# Altium footprint library ALL.PcbLib: 385 footprints (part 8 of 25)
Each footprint in its own frame and in the unit in brackets; x right, y up, seen from the top. Pads: shape width x height; smd on the part's side, far side on the other; paste and mask are expansions set on the pad; w line width, h text height; cw(c..) or ccw(c..) is an arc to the next point about the centre after c.
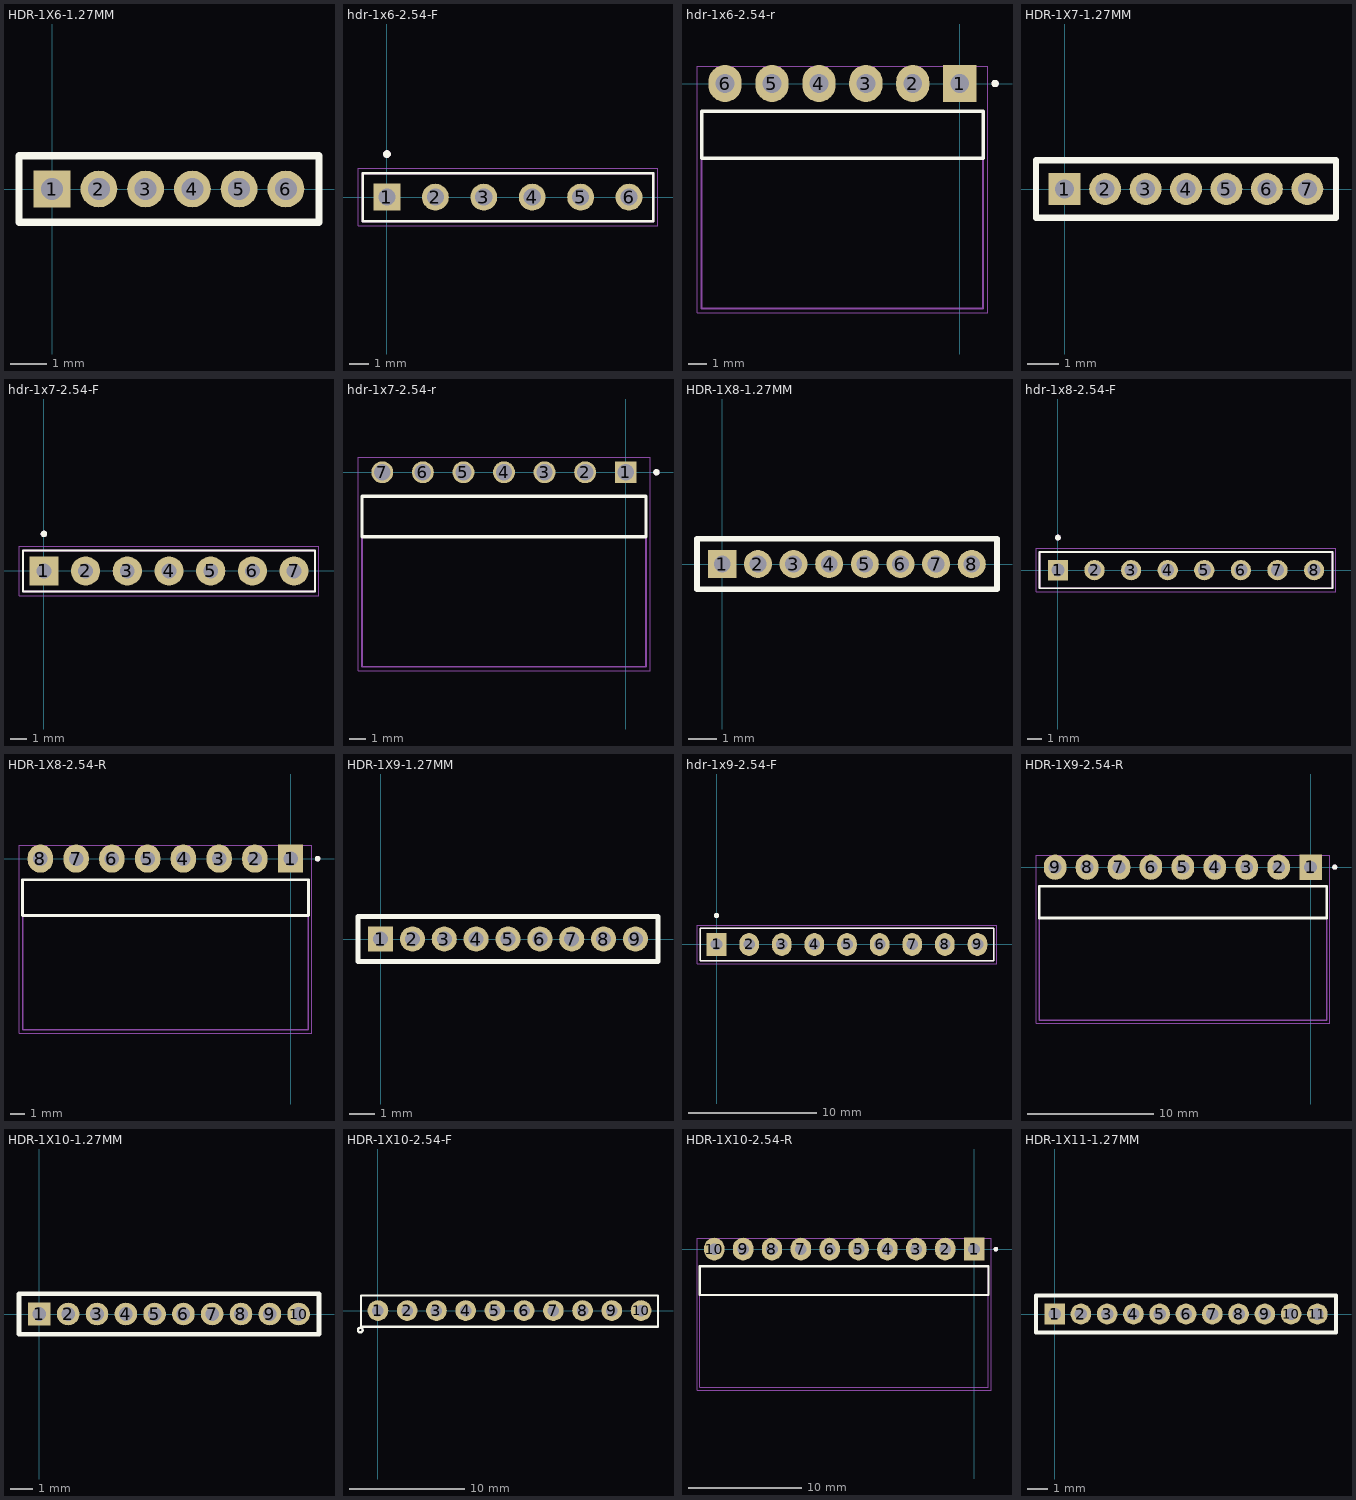
[diagram p7: the footprints below, top view; thin cyan lines are the x and y axes]

## HDR-1X6-1.27MM [mm]
pads (6):
  rect 1x1 hole 0.6: 1(0,0)
  round 1 hole 0.6: 2(1.27,0) 3(2.54,0) 4(3.81,0) 5(5.08,0) 6(6.35,0)
Top Overlay:
  lines w0.2: -0.9,-0.9 7.25,-0.9 7.25,0.9 -0.9,0.9 -0.9,-0.9
3D body "TMS-106-52-S-S.stp": height 7.75, standoff -3.05, extent -0.661,-1.118 6.959,1.321

## hdr-1x6-2.54-F [mm]
pads (6):
  rect 1.408x1.408 hole 0.9: 1(0,0)
  round 1.408 hole 0.9: 2(2.54,0) 3(5.08,0) 4(7.62,0) 5(10.16,0) 6(12.7,0)
Top Overlay:
  circle w0.2: c0,2.26 r0.1
  lines w0.127: -1.27,-1.26 13.97,-1.26 13.97,1.26 -1.27,1.26 -1.27,-1.26
Mechanical 13:
  circle w0.2: c0,2.26 r0.1
  lines w0.127: -1.27,-1.26 13.97,-1.26 13.97,1.26 -1.27,1.26 -1.27,-1.26
Mechanical 15:
  lines w0.05: -1.52,-1.51 14.22,-1.51 14.22,1.51 -1.52,1.51 -1.52,-1.51
3D body "215297-6.stp": height 7.11, standoff -2.89, extent -1.27,-1.26 13.97,1.26

## hdr-1x6-2.54-r [mm]
pads (6):
  rect 1.8x2 hole 1.02: 1(0,0)
  oval 1.8x2 hole 1.02: 2(-2.54,0) 3(-5.08,0) 4(-7.62,0) 5(-10.16,0) 6(-12.7,0)
Top Overlay:
  circle w0.2: c1.92,0 r0.1
  lines w0.2: -13.97,-4.04 -13.97,-1.5 1.27,-1.5 1.27,-4.04 -13.97,-4.04
Mechanical 13:
  circle w0.2: c1.92,0 r0.1
  lines w0.1: -13.97,-4.04 -13.97,-1.5 1.27,-1.5 1.27,-4.04 ; -13.97,-4.04 1.27,-4.04 ; -13.97,-4.04 -13.97,-12.17 1.27,-12.17 1.27,-4.04
Mechanical 15:
  lines w0.05: -14.22,-12.42 -14.22,0.935 1.52,0.935 1.52,-12.42 -14.22,-12.42
3D body "TSW-106-16-G-S-RA.stp": height 3.07, standoff -5.03, extent -13.97,-12.192 1.27,0.318

## HDR-1X7-1.27MM [mm]
pads (7):
  rect 1x1 hole 0.6: 1(0,0)
  round 1 hole 0.6: 2(1.27,0) 3(2.54,0) 4(3.81,0) 5(5.08,0) 6(6.35,0) 7(7.62,0)
Top Overlay:
  lines w0.2: -0.9,-0.9 8.52,-0.9 8.52,0.9 -0.9,0.9 -0.9,-0.9
3D body "TMS-107-52-S-S.stp": height 7.75, standoff -3.05, extent -0.584,-1.168 8.306,1.27

## hdr-1x7-2.54-F [mil]
pads (7):
  rect 70x70 hole 35.43: 1(0,0)
  round 70 hole 35.43: 2(100,0) 3(200,0) 4(300,0) 5(400,0) 6(500,0) 7(600,0)
Top Overlay:
  circle w7.87: c0,88.98 r3.94
  lines w5: -50,-49.61 -50,49.61 650,49.61 650,-49.61 -50,-49.61
Mechanical 13:
  circle w7.87: c0,88.98 r3.94
  lines w5: -50,-49.61 -50,49.61 650,49.61 650,-49.61 -50,-49.61
Mechanical 15:
  lines w1.97: -59.84,-59.45 -59.84,59.45 659.84,59.45 659.84,-59.45 -59.84,-59.45
3D body "215297-7--3DModel-STEP-1 (1).STEP": height 276, standoff -117.7, extent -50,-49.21 650,50

## hdr-1x7-2.54-r [mm]
pads (7):
  rect 1.37x1.37 hole 1.02: 1(0,0)
  round 1.37 hole 1.02: 2(-2.54,0) 3(-5.08,0) 4(-7.62,0) 5(-10.16,0) 6(-12.7,0) 7(-15.24,0)
Top Overlay:
  circle w0.2: c1.92,0 r0.1
  lines w0.2: -16.51,-4.04 -16.51,-1.5 1.27,-1.5 1.27,-4.04 -16.51,-4.04
Mechanical 13:
  circle w0.2: c1.92,0 r0.1
  lines w0.1: -16.51,-4.04 -16.51,-1.5 1.27,-1.5 1.27,-4.04 ; -16.51,-4.04 1.27,-4.04 ; -16.51,-4.04 -16.51,-12.17 1.27,-12.17 1.27,-4.04
Mechanical 15:
  lines w0.05: -16.76,-12.42 -16.76,0.935 1.52,0.935 1.52,-12.42 -16.76,-12.42
3D body "TSW-107-16-G-S-RA.stp": height 3.05, standoff -5.05, extent -16.51,-12.192 1.27,0.318

## HDR-1X8-1.27MM [mm]
pads (8):
  rect 1x1 hole 0.6: 1(0,0)
  round 1 hole 0.6: 2(1.27,0) 3(2.54,0) 4(3.81,0) 5(5.08,0) 6(6.35,0) 7(7.62,0) 8(8.89,0)
Top Overlay:
  lines w0.2: -0.9,-0.9 -0.9,0.9 9.79,0.9 9.79,-0.9 -0.9,-0.9
3D body "TMS-108-52-S-S.stp": height 7.75, standoff -3.05, extent -0.635,-1.118 9.525,1.321

## hdr-1x8-2.54-F [mm]
pads (8):
  rect 1.408x1.408 hole 0.9: 1(0,0)
  round 1.408 hole 0.9: 2(2.54,0) 3(5.08,0) 4(7.62,0) 5(10.16,0) 6(12.7,0) 7(15.24,0) 8(17.78,0)
Top Overlay:
  circle w0.2: c0,2.26 r0.1
  lines w0.127: -1.27,-1.26 -1.27,1.26 19.05,1.26 19.05,-1.26 -1.27,-1.26
Mechanical 13:
  circle w0.2: c0,2.26 r0.1
  lines w0.127: -1.27,-1.26 -1.27,1.26 19.05,1.26 19.05,-1.26 -1.27,-1.26
Mechanical 15:
  lines w0.05: -1.52,-1.51 -1.52,1.51 19.3,1.51 19.3,-1.51 -1.52,-1.51
3D body "215297-8--3DModel-STEP-1.STEP": height 7.01, standoff -2.99, extent -1.397,-1.26 18.923,1.26

## HDR-1X8-2.54-R [mm]
pads (8):
  rect 1.8x2 hole 1.02: 1(0,0)
  oval 1.8x2 hole 1.02: 2(-2.54,0) 3(-5.08,0) 4(-7.62,0) 5(-10.16,0) 6(-12.7,0) 7(-15.24,0) 8(-17.78,0)
Top Overlay:
  circle w0.2: c1.92,0 r0.1
  lines w0.2: -19.05,-4.04 -19.05,-1.5 1.27,-1.5 1.27,-4.04 -19.05,-4.04
Mechanical 13:
  circle w0.2: c1.92,0 r0.1
  lines w0.1: -19.05,-4.04 -19.05,-1.5 1.27,-1.5 1.27,-4.04 ; -19.05,-4.04 1.27,-4.04 ; -19.05,-4.04 -19.05,-12.17 1.27,-12.17 1.27,-4.04
Mechanical 15:
  lines w0.05: -19.3,-12.42 -19.3,0.935 1.52,0.935 1.52,-12.42 -19.3,-12.42
3D body "TSW-108-16-G-S-RA.stp": height 3.07, standoff -5.03, extent -19.05,-12.065 1.27,0.445

## HDR-1X9-1.27MM [mm]
pads (9):
  rect 1x1 hole 0.6: 1(0,0)
  round 1 hole 0.6: 2(1.27,0) 3(2.54,0) 4(3.81,0) 5(5.08,0) 6(6.35,0) 7(7.62,0) 8(8.89,0) 9(10.16,0)
Top Overlay:
  lines w0.2: -0.9,-0.9 -0.9,0.9 11.06,0.9 11.06,-0.9 -0.9,-0.9
3D body "TMS-109-52-S-S.stp": height 7.75, standoff -3.05, extent -0.635,-1.219 10.795,1.219

## hdr-1x9-2.54-F [mil]
pads (9):
  rect 60x70 hole 35.43: 1(0,0)
  oval 60x70 hole 35.43: 2(100,0) 3(200,0) 4(300,0) 5(400,0) 6(500,0) 7(600,0) 8(700,0) 9(800,0)
Top Overlay:
  circle w7.87: c0,88.98 r3.94
  lines w5: -50,-49.61 -50,49.61 850,49.61 850,-49.61 -50,-49.61
Mechanical 13:
  circle w7.87: c0,88.98 r3.94
  lines w5: -50,-49.61 -50,49.61 850,49.61 850,-49.61 -50,-49.61
Mechanical 15:
  lines w1.97: -59.84,-59.45 -59.84,59.45 859.84,59.45 859.84,-59.45 -59.84,-59.45
3D body "215297-9--3DModel-STEP-1 (1).STEP": height 276, standoff -117.7, extent -49.99,-49.6 850.01,49.61

## HDR-1X9-2.54-R [mm]
pads (9):
  rect 1.8x2 hole 1.02: 1(0,0)
  oval 1.8x2 hole 1.02: 2(-2.54,0) 3(-5.08,0) 4(-7.62,0) 5(-10.16,0) 6(-12.7,0) 7(-15.24,0) 8(-17.78,0) 9(-20.32,0)
Top Overlay:
  circle w0.2: c1.92,0 r0.1
  lines w0.2: -21.59,-4.04 -21.59,-1.5 1.27,-1.5 1.27,-4.04 -21.59,-4.04
Mechanical 13:
  circle w0.2: c1.92,0 r0.1
  lines w0.1: -21.59,-4.04 -21.59,-1.5 1.27,-1.5 1.27,-4.04 ; -21.59,-4.04 1.27,-4.04 ; -21.59,-4.04 -21.59,-12.17 1.27,-12.17 1.27,-4.04
Mechanical 15:
  lines w0.05: -21.84,-12.42 -21.84,0.935 1.52,0.935 1.52,-12.42 -21.84,-12.42
3D body "TSW-109-16-G-S-RA.stp": height 3.07, standoff -5.03, extent -21.59,-12.129 1.27,0.381

## HDR-1X10-1.27MM [mm]
pads (10):
  rect 1x1 hole 0.6: 1(0,0)
  round 1 hole 0.6: 2(1.27,0) 3(2.54,0) 4(3.81,0) 5(5.08,0) 6(6.35,0) 7(7.62,0) 8(8.89,0) 9(10.16,0) 10(11.43,0)
Top Overlay:
  lines w0.2: -0.9,-0.9 -0.9,0.9 12.33,0.9 12.33,-0.9 -0.9,-0.9
3D body "TMS-110-52-S-S.stp": height 7.75, standoff -3.05, extent -0.635,-1.219 12.065,1.219

## HDR-1X10-2.54-F [mm]
pads (10):
  round 1.8 hole 1 mask+0.1: 1(0,0) 2(2.54,0) 3(5.08,0) 4(7.62,0) 5(10.16,0) 6(12.7,0) 7(15.24,0) 8(17.78,0) 9(20.32,0) 10(22.86,0)
Top Overlay:
  circle w0.2: c-1.53,-1.7 r0.2
  lines w0.2: -1.47,-1.4 -1.47,1.3 24.33,1.3 24.33,-1.4 -1.47,-1.4
3D body "female_header_a-bl254-eg-g02d.stp": height 8.5, standoff -3.2, extent 18.925,-1.3 24.255,1.2
3D body "female_header_a-bl254-eg-g02d.stp": height 8.5, standoff -3.2, extent 13.845,-1.3 19.175,1.2
3D body "female_header_a-bl254-eg-g03d.stp": height 8.5, standoff -3.2, extent -1.395,-1.3 6.475,1.2
3D body "female_header_a-bl254-eg-g03d.stp": height 8.5, standoff -3.2, extent 6.225,-1.3 14.095,1.2

## HDR-1X10-2.54-R [mm]
pads (10):
  rect 1.8x2 hole 1.02: 1(0,0)
  oval 1.8x2 hole 1.02: 2(-2.54,0) 3(-5.08,0) 4(-7.62,0) 5(-10.16,0) 6(-12.7,0) 7(-15.24,0) 8(-17.78,0) 9(-20.32,0) 10(-22.86,0)
Top Overlay:
  circle w0.2: c1.92,0 r0.1
  lines w0.2: -24.13,-4.04 -24.13,-1.5 1.27,-1.5 1.27,-4.04 -24.13,-4.04
Mechanical 13:
  circle w0.2: c1.92,0 r0.1
  lines w0.1: -24.13,-4.04 -24.13,-1.5 1.27,-1.5 1.27,-4.04 ; -24.13,-4.04 1.27,-4.04 ; -24.13,-4.04 -24.13,-12.17 1.27,-12.17 1.27,-4.04
Mechanical 15:
  lines w0.05: -24.38,-12.42 -24.38,0.935 1.52,0.935 1.52,-12.42 -24.38,-12.42
3D body "TSW-110-16-G-S-RA.stp": height 3.27, standoff -4.83, extent -24.231,-12.141 1.169,0.368

## HDR-1X11-1.27MM [mm]
pads (11):
  rect 1x1 hole 0.6: 1(0,0)
  round 1 hole 0.6: 2(1.27,0) 3(2.54,0) 4(3.81,0) 5(5.08,0) 6(6.35,0) 7(7.62,0) 8(8.89,0) 9(10.16,0) 10(11.43,0) 11(12.7,0)
Top Overlay:
  lines w0.2: -0.9,-0.9 -0.9,0.9 13.6,0.9 13.6,-0.9 -0.9,-0.9
3D body "TMS-111-52-S-S.stp": height 7.75, standoff -3.05, extent -0.711,-1.219 13.259,1.219